# Altium footprint library myPCBLib (AirPC's conflicted copy 2014-06-14).PcbLib: 57 footprints (part 4 of 4)
Each footprint in its own frame and in the unit in brackets; x right, y up, seen from the top. Pads: shape width x height; smd on the part's side, far side on the other; paste and mask are expansions set on the pad; w line width, h text height; cw(c..) or ccw(c..) is an arc to the next point about the centre after c.
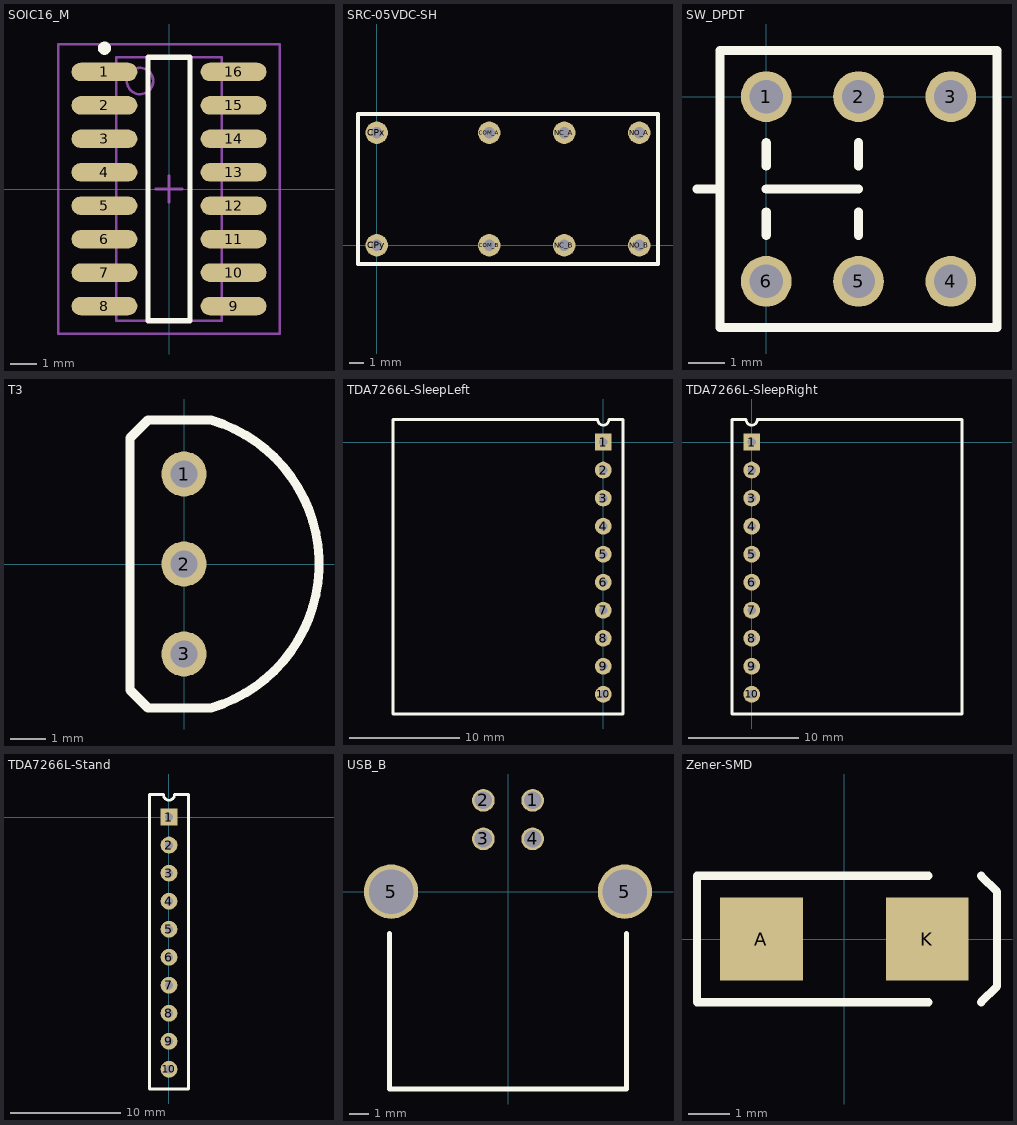
[diagram p3: the footprints below, top view; thin cyan lines are the x and y axes]

## SOIC16_M [mm]
pads (16):
  oval 2.5x0.7 smd: 1(-2.45,4.445) 2(-2.45,3.175) 3(-2.45,1.905) 4(-2.45,0.635) 5(-2.45,-0.635) 6(-2.45,-1.905) 7(-2.45,-3.175) 8(-2.45,-4.445) 9(2.45,-4.445) 10(2.45,-3.175) 11(2.45,-1.905) 12(2.45,-0.635) 13(2.45,0.635) 14(2.45,1.905) 15(2.45,3.175) 16(2.45,4.445)
Top Overlay:
  circle w0.25: c-2.45,5.345 r0.125
  lines w0.2: -0.8,-5 0.8,-5 0.8,5 -0.8,5 -0.8,-5
Mechanical 13:
  circle w0.1: c-1.1,4.1 r0.5
  lines w0.1: -2,-5 2,-5 2,5 -2,5 -2,-5
Mechanical 15:
  lines w0.1: -0.5,0 0.5,0 ; 0,-0.5 0,0.5 ; -4.2,-5.5 4.2,-5.5 4.2,5.5 -4.2,5.5 -4.2,-5.5
3D body: height 1.91, standoff 0, extent -2.032,-5 1.968,5

## SRC-05VDC-SH [mil] "Tele-Comunication Relay"
height 450
pads (8):
  round 60 hole 30: COM_A(300,300) COM_B(300,0) CPx(0,300) CPy(0,0) NC_A(500,300) NC_B(500,0) NO_A(700,300) NO_B(700,0)
Top Overlay:
  lines w10: -50,-50 750,-50 750,350 -50,350 -50,-50

## SW_DPDT [mil]
pads (6):
  round 55 hole 36: 1(0,0) 2(100,0) 3(200,0) 4(200,-200) 5(100,-200) 6(0,-200)
Top Overlay:
  lines w10: -75,-100 -50,-100 ; 0,-150 0,-125 ; 0,-100 100,-100 ; 0,-75 0,-50 ; 100,-150 100,-125 ; 100,-75 100,-50 ; -50,-250 250,-250 250,50 -50,50 -50,-250

## T3 [mil] "Transistor truogh hole - 100 mil pitch - 3 pin"
pads (3):
  round 50 hole 30: 1(0,100) 2(0,0) 3(0,-100)
Top Overlay:
  lines w10: -60,-140 -60,140 -40,160 30,160 cw(c-16.67,0) 30,-160 -40,-160 -60,-140
  text "." at -100,100 h60

## TDA7266L-SleepLeft [mil]
height 118.11
pads (10):
  rect 60x60 hole 30: 1(0,0)
  round 60 hole 30: 2(0,-100) 3(0,-200) 4(0,-300) 5(0,-400) 6(0,-500) 7(0,-600) 8(0,-700) 9(0,-800) 10(0,-900)
Top Overlay:
  lines w10: -750,-970 70,-970 70,80 20,80 cw(c0,80) -20,80 -750,80 -750,-970

## TDA7266L-SleepRight [mil]
height 118.11
pads (10):
  rect 60x60 hole 30: 1(0,0)
  round 60 hole 30: 2(0,-100) 3(0,-200) 4(0,-300) 5(0,-400) 6(0,-500) 7(0,-600) 8(0,-700) 9(0,-800) 10(0,-900)
Top Overlay:
  lines w10: -70,-970 -70,80 -20,80 ccw(c0,80) 20,80 750,80 750,-970 -70,-970

## TDA7266L-Stand [mil]
height 708.66
pads (10):
  rect 60x60 hole 30: 1(0,0)
  round 60 hole 30: 2(0,-100) 3(0,-200) 4(0,-300) 5(0,-400) 6(0,-500) 7(0,-600) 8(0,-700) 9(0,-800) 10(0,-900)
Top Overlay:
  lines w10: -70,-970 70,-970 70,80 20,80 cw(c0,80) -20,80 -70,80 -70,-970

## USB_B [mil]
height 430
pads (6):
  round 46 hole 36: 1(50,185) 2(-50,185) 3(-50,107) 4(50,107)
  round 110 hole 90: 5(-237,0) 5(237,0)
Top Overlay:
  lines w10: -240,-85 -240,-400 240,-400 240,-85
3D body: height 440, standoff -136.49, extent -291.32,-405.31 291.32,244.29

## Zener-SMD [mm]
pads (2):
  rect 2x2 smd: A(-2,0) K(2,0)
Top Overlay:
  lines w0.2: 2.032,-1.524 -3.556,-1.524 -3.556,1.524 2.032,1.524 ; 3.302,-1.524 3.683,-1.143 3.683,-1.016 3.683,1.016 3.683,1.143 3.302,1.524